# Altium footprint library BBC_Footprints.PcbLib: 172 footprints (part 11 of 11)
Each footprint in its own frame and in the unit in brackets; x right, y up, seen from the top. Pads: shape width x height; smd on the part's side, far side on the other; paste and mask are expansions set on the pad; w line width, h text height; cw(c..) or ccw(c..) is an arc to the next point about the centre after c.
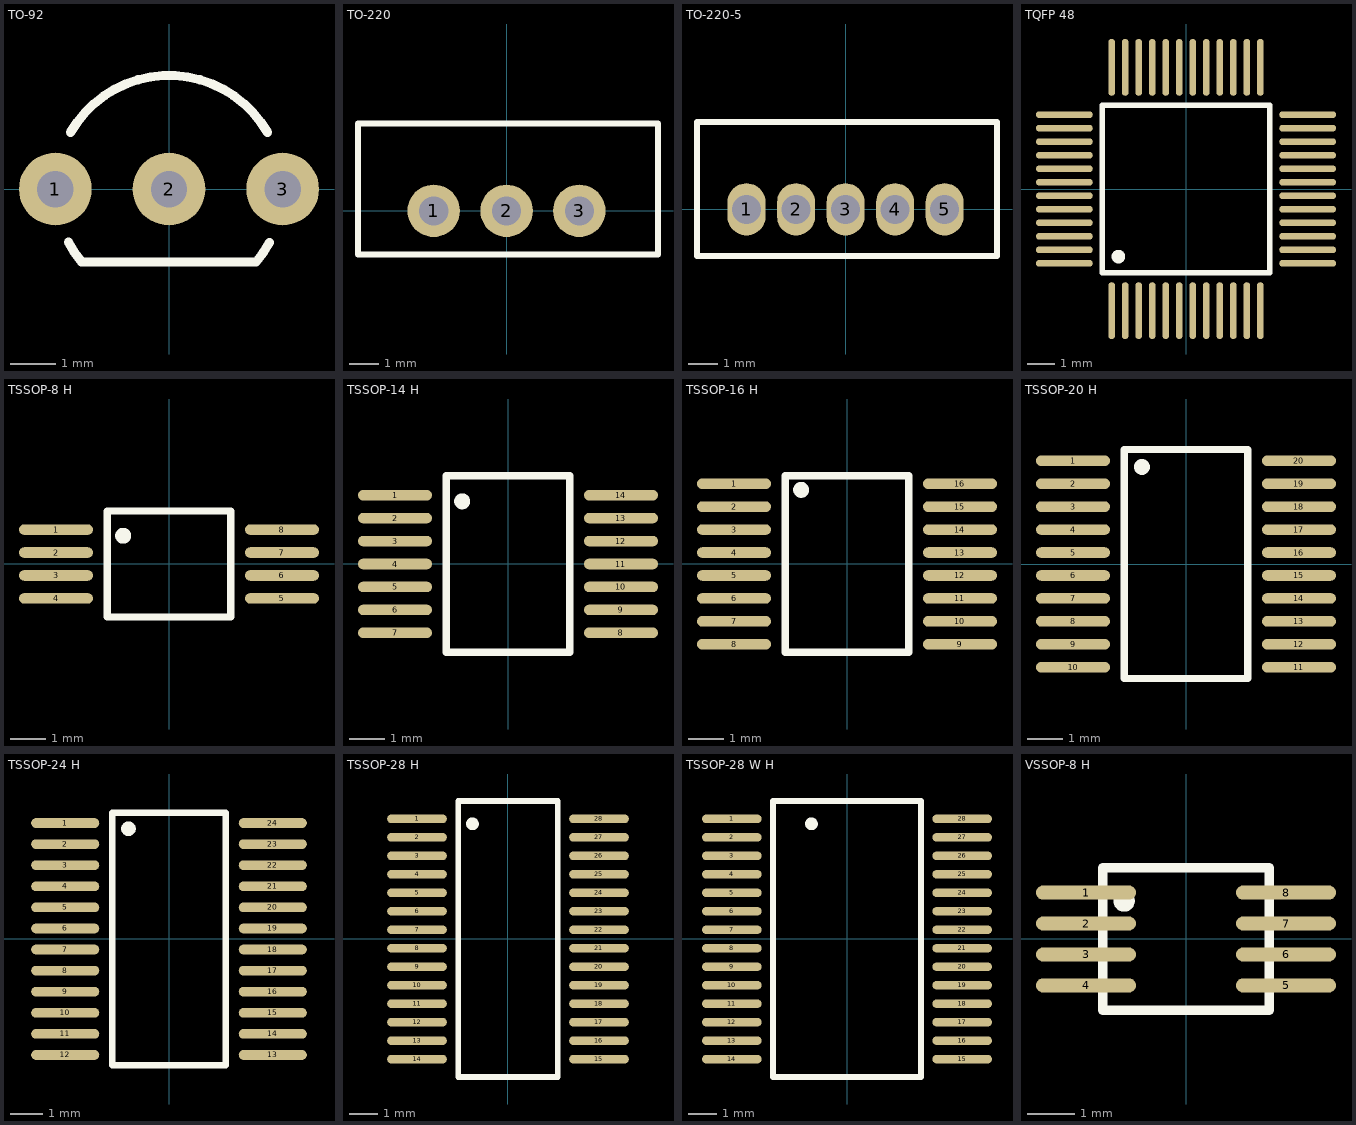
[diagram p10: the footprints below, top view; thin cyan lines are the x and y axes]

## TO-92 [mm]
height 15
pads (3):
  round 1.6 hole 0.8: 1(-2.5,0) 2(0,0) 3(2.5,0)
Top Overlay:
  lines w0.2: -2.213,-1.169 ccw(c-0.006,0.004) -1.921,-1.603 ; -2.165,1.25 cw(c0,0) 2.165,1.25 ; -1.915,-1.607 1.915,-1.607 ccw(c0,0) 2.207,-1.174
3D body "TO-92.STEP": height 9, standoff -4, extent -2.79,-1.59 2.79,2.613

## TO-220 [mm]
pads (3):
  round 1.8 hole 1: 1(-2.5,0) 2(0,0) 3(2.5,0)
Top Overlay:
  lines w0.2: -5.1,-1.5 -5.1,3 5.2,3 5.2,-1.5 -5.1,-1.5
3D body "TO-220.step": height 16.8, standoff -9, extent -5.1,-1.5 5.2,3

## TO-220-5 [mm]
pads (5):
  oval 1.3x1.8 hole 1: 1(-3.4,0) 2(-1.7,0) 3(0,0) 4(1.7,0) 5(3.4,0)
Top Overlay:
  lines w0.2: -5.1,-1.6 -5.1,3 5.2,3 5.2,-1.6 -5.1,-1.6
3D body "TO-220-5.step": height 15, standoff -12.82, extent -5.1,-1.95 5.06,3

## TQFP 48 [mm]
pads (48):
  oval 0.25x2.1 smd: 1(-2.75,-4.5) 2(-2.25,-4.5) 3(-1.75,-4.5) 4(-1.25,-4.5) 5(-0.75,-4.5) 6(-0.25,-4.5) 7(0.25,-4.5) 8(0.75,-4.5) 9(1.25,-4.5) 10(1.75,-4.5) 11(2.25,-4.5) 12(2.75,-4.5) 25(2.75,4.5) 26(2.25,4.5) 27(1.75,4.5) 28(1.25,4.5) 29(0.75,4.5) 30(0.25,4.5) 31(-0.25,4.5) 32(-0.75,4.5) 33(-1.25,4.5) 34(-1.75,4.5) 35(-2.25,4.5) 36(-2.75,4.5)
  oval 2.1x0.25 smd: 13(4.5,-2.75) 14(4.5,-2.25) 15(4.5,-1.75) 16(4.5,-1.25) 17(4.5,-0.75) 18(4.5,-0.25) 19(4.5,0.25) 20(4.5,0.75) 21(4.5,1.25) 22(4.5,1.75) 23(4.5,2.25) 24(4.5,2.75) 37(-4.5,2.75) 38(-4.5,2.25) 39(-4.5,1.75) 40(-4.5,1.25) 41(-4.5,0.75) 42(-4.5,0.25) 43(-4.5,-0.25) 44(-4.5,-0.75) 45(-4.5,-1.25) 46(-4.5,-1.75) 47(-4.5,-2.25) 48(-4.5,-2.75)
Top Overlay:
  circle w0.4: c-2.5,-2.5 r0.05
  lines w0.2: -3.1,-3.1 3.1,-3.1 3.1,3.1 -3.1,3.1 -3.1,-3.1
3D body "TQFP-48.STEP": height 1.45, standoff -0.01, extent -4.5,-4.5 4.5,4.5

## TSSOP-8 H [mm] "TSSOP-8 for hand soldering"
height 3
pads (8):
  oval 2.1x0.3 smd: 1(-3.2,0.975) 2(-3.2,0.325) 3(-3.2,-0.325) 4(-3.2,-0.975) 5(3.2,-0.975) 6(3.2,-0.325) 7(3.2,0.325) 8(3.2,0.975)
Top Overlay:
  circle w0.25: c-1.3,0.8 r0.1
  lines w0.2: -1.75,-1.5 1.75,-1.5 1.75,1.5 -1.75,1.5 -1.75,-1.5
3D body "TSSOP-8.STEP": height 1.2, standoff 0, extent -3.2,-1.5 3.2,1.5

## TSSOP-14 H [mm] "TSSOP-14 for hand soldering"
height 3
pads (14):
  oval 2.1x0.3 smd paste+0: 1(-3.2,1.95)
  oval 2.1x0.3 smd: 2(-3.2,1.3) 3(-3.2,0.65) 4(-3.2,0) 5(-3.2,-0.65) 6(-3.2,-1.3) 7(-3.2,-1.95) 8(3.2,-1.95) 9(3.2,-1.3) 10(3.2,-0.65) 11(3.2,0) 12(3.2,0.65) 13(3.2,1.3) 14(3.2,1.95)
Top Overlay:
  circle w0.25: c-1.3,1.775 r0.1
  lines w0.2: -1.75,-2.5 -1.75,2.5 1.75,2.5 1.75,-2.5 -1.75,-2.5
3D body "TSSOP-14.STEP": height 1.2, standoff 0, extent -3.2,-2.5 3.2,2.5

## TSSOP-16 H [mm] "TSSOP-16 for hand soldering"
height 3
pads (16):
  oval 2.1x0.3 smd: 1(-3.2,2.275) 2(-3.2,1.625) 3(-3.2,0.975) 4(-3.2,0.325) 5(-3.2,-0.325) 6(-3.2,-0.975) 7(-3.2,-1.625) 8(-3.2,-2.275) 9(3.2,-2.275) 10(3.2,-1.625) 11(3.2,-0.975) 12(3.2,-0.325) 13(3.2,0.325) 14(3.2,0.975) 15(3.2,1.625) 16(3.2,2.275)
Top Overlay:
  circle w0.25: c-1.3,2.1 r0.1
  lines w0.2: -1.75,-2.5 -1.75,2.5 1.75,2.5 1.75,-2.5 -1.75,-2.5
3D body "TSSOP-16.STEP": height 1.2, standoff 0, extent -3.2,-2.5 3.2,2.5

## TSSOP-20 H [mm] "TSSOP-20 for hand soldering"
height 3
pads (20):
  oval 2.1x0.3 smd: 1(-3.2,2.925) 2(-3.2,2.275) 3(-3.2,1.625) 4(-3.2,0.975) 5(-3.2,0.325) 6(-3.2,-0.325) 7(-3.2,-0.975) 8(-3.2,-1.625) 9(-3.2,-2.275) 10(-3.2,-2.925) 11(3.2,-2.925) 12(3.2,-2.275) 13(3.2,-1.625) 14(3.2,-0.975) 15(3.2,-0.325) 16(3.2,0.325) 17(3.2,0.975) 18(3.2,1.625) 19(3.2,2.275) 20(3.2,2.925)
Top Overlay:
  circle w0.25: c-1.25,2.75 r0.1
  lines w0.2: -1.75,-3.25 1.75,-3.25 1.75,3.25 -1.75,3.25 -1.75,-3.25
3D body "TSSOP-20.STEP": height 1.2, standoff 0, extent -3.2,-3.25 3.2,3.25

## TSSOP-24 H [mm] "TSSOP-24 for hand soldering"
height 3
pads (24):
  oval 2.1x0.3 smd: 1(-3.2,3.575) 2(-3.2,2.925) 3(-3.2,2.275) 4(-3.2,1.625) 5(-3.2,0.975) 6(-3.2,0.325) 7(-3.2,-0.325) 8(-3.2,-0.975) 9(-3.2,-1.625) 10(-3.2,-2.275) 11(-3.2,-2.925) 12(-3.2,-3.575) 13(3.2,-3.575) 14(3.2,-2.925) 15(3.2,-2.275) 16(3.2,-1.625) 17(3.2,-0.975) 18(3.2,-0.325) 19(3.2,0.325) 20(3.2,0.975) 21(3.2,1.625) 22(3.2,2.275) 23(3.2,2.925) 24(3.2,3.575)
Top Overlay:
  circle w0.25: c-1.25,3.4 r0.1
  lines w0.2: -1.75,-3.9 -1.75,3.9 1.75,3.9 1.75,-3.9 -1.75,-3.9
3D body "TSSOP-24.STEP": height 1.2, standoff 0, extent -3.2,-3.9 3.2,3.9

## TSSOP-28 H [mm] "TSSOP-28 for hand soldering"
height 3
pads (28):
  oval 2.1x0.3 smd: 1(-3.2,4.225) 2(-3.2,3.575) 3(-3.2,2.925) 4(-3.2,2.275) 5(-3.2,1.625) 6(-3.2,0.975) 7(-3.2,0.325) 8(-3.2,-0.325) 9(-3.2,-0.975) 10(-3.2,-1.625) 11(-3.2,-2.275) 12(-3.2,-2.925) 13(-3.2,-3.575) 14(-3.2,-4.225) 15(3.2,-4.225) 16(3.2,-3.575) 17(3.2,-2.925) 18(3.2,-2.275) 19(3.2,-1.625) 20(3.2,-0.975) 21(3.2,-0.325) 22(3.2,0.325) 23(3.2,0.975) 24(3.2,1.625) 25(3.2,2.275) 26(3.2,2.925) 27(3.2,3.575) 28(3.2,4.225)
Top Overlay:
  circle w0.25: c-1.25,4.05 r0.1
  lines w0.2: -1.75,-4.85 1.75,-4.85 1.75,4.85 -1.75,4.85 -1.75,-4.85
3D body "TSSOP-28.STEP": height 1.2, standoff 0, extent -3.2,-4.85 3.2,4.85

## TSSOP-28 W H [mm] "TSSOP-28 wide for hand soldering"
height 3
pads (28):
  oval 2.1x0.3 smd: 1(-4.05,4.225) 2(-4.05,3.575) 3(-4.05,2.925) 4(-4.05,2.275) 5(-4.05,1.625) 6(-4.05,0.975) 7(-4.05,0.325) 8(-4.05,-0.325) 9(-4.05,-0.975) 10(-4.05,-1.625) 11(-4.05,-2.275) 12(-4.05,-2.925) 13(-4.05,-3.575) 14(-4.05,-4.225) 15(4.05,-4.225) 16(4.05,-3.575) 17(4.05,-2.925) 18(4.05,-2.275) 19(4.05,-1.625) 20(4.05,-0.975) 21(4.05,-0.325) 22(4.05,0.325) 23(4.05,0.975) 24(4.05,1.625) 25(4.05,2.275) 26(4.05,2.925) 27(4.05,3.575) 28(4.05,4.225)
Top Overlay:
  circle w0.25: c-1.25,4.05 r0.1
  lines w0.2: -2.6,-4.85 -2.6,4.85 2.6,4.85 2.6,-4.85 -2.6,-4.85
3D body "TSSOP-28W.STEP": height 1.2, standoff 0, extent -4.05,-4.85 4.05,4.85

## VSSOP-8 H [mm] "TSSOP-8 for hand soldering"
height 3
pads (8):
  oval 2.1x0.3 smd: 1(-2.1,0.975) 2(-2.1,0.325) 3(-2.1,-0.325) 4(-2.1,-0.975) 5(2.1,-0.975) 6(2.1,-0.325) 7(2.1,0.325) 8(2.1,0.975)
Top Overlay:
  circle w0.25: c-1.3,0.8 r0.1
  lines w0.2: -1.75,-1.5 1.75,-1.5 1.75,1.5 -1.75,1.5 -1.75,-1.5
3D body "User Library-VSSOP8 3x3 e0_65-1.step": height 1.1, standoff 0, extent -2.5,-1.5 2.5,1.5